# Altium integrated library 兰格封装.IntLib: 1176 symbols (part 2 of 6) (continued)
## HDR  2.54MM  1X16
designator P*
仓库名称: 五金仓; 加工方式: 插件; 助记码: *; 单位: *; 备注: *; 物料代码: *; 物料名称: *; 规格型号: *
footprint HDR-1X16 (排针，16脚)
pins: 1, 2, 3, 4, 5, 6, 7, 8, 9, 10, 11, 12, 13, 14, 15, 16

## HDR  2.54MM  1X16_M
designator P*
仓库名称: 五金仓; 加工方式: 插件; 助记码: *; 规格型号: *; 物料代码: *; 物料名称: *; 单位: *; 备注: *
footprint HDR-1X16_M (排母，16脚)
pins: 1, 2, 3, 4, 5, 6, 7, 8, 9, 10, 11, 12, 13, 14, 15, 16

## HDR  2.54MM  1X16_W
designator P*
仓库名称: 五金仓; 加工方式: 插件; 助记码: *; 单位: *; 备注: *; 物料代码: *; 物料名称: *; 规格型号: *
footprint HDR-1X16_W (弯脚排针，16脚)
pins: 1, 2, 3, 4, 5, 6, 7, 8, 9, 10, 11, 12, 13, 14, 15, 16

## HDR  2.54MM  1X16_Y
designator P*
仓库名称: 五金仓; 加工方式: 插件; 物料名称: *; 规格型号: *; 助记码: *; 单位: *; 备注: *; 物料代码: *
footprint HDR-1X16_Y (圆孔排母，16脚)
pins: 1, 2, 3, 4, 5, 6, 7, 8, 9, 10, 11, 12, 13, 14, 15, 16

## HDR  2.54MM  1X17
designator P*
仓库名称: 五金仓; 加工方式: 插件; 单位: *; 助记码: *; 备注: *; 规格型号: *; 物料名称: *; 物料代码: *
footprint HDR-1X17 (排针，17脚)
pins: 1, 2, 3, 4, 5, 6, 7, 8, 9, 10, 11, 12, 13, 14, 15, 16, 17

## HDR  2.54MM  1X17_M
designator P*
仓库名称: 五金仓; 加工方式: 插件; 助记码: *; 单位: *; 备注: *; 物料名称: *; 规格型号: *; 物料代码: *
footprint HDR-1X17_M (排母，17脚)
pins: 1, 2, 3, 4, 5, 6, 7, 8, 9, 10, 11, 12, 13, 14, 15, 16, 17

## HDR  2.54MM  1X17_W
designator P*
仓库名称: 五金仓; 加工方式: 插件; 物料名称: *; 规格型号: *; 助记码: *; 单位: *; 备注: *; 物料代码: *
footprint HDR-1X17_W (弯脚排针，17脚)
pins: 1, 2, 3, 4, 5, 6, 7, 8, 9, 10, 11, 12, 13, 14, 15, 16, 17

## HDR  2.54MM  1X17_Y
designator P*
仓库名称: 五金仓; 加工方式: 插件; 物料名称: *; 规格型号: *; 物料代码: *; 助记码: *; 单位: *; 备注: *
footprint HDR-1X17_Y (圆孔排母，17脚)
pins: 1, 2, 3, 4, 5, 6, 7, 8, 9, 10, 11, 12, 13, 14, 15, 16, 17

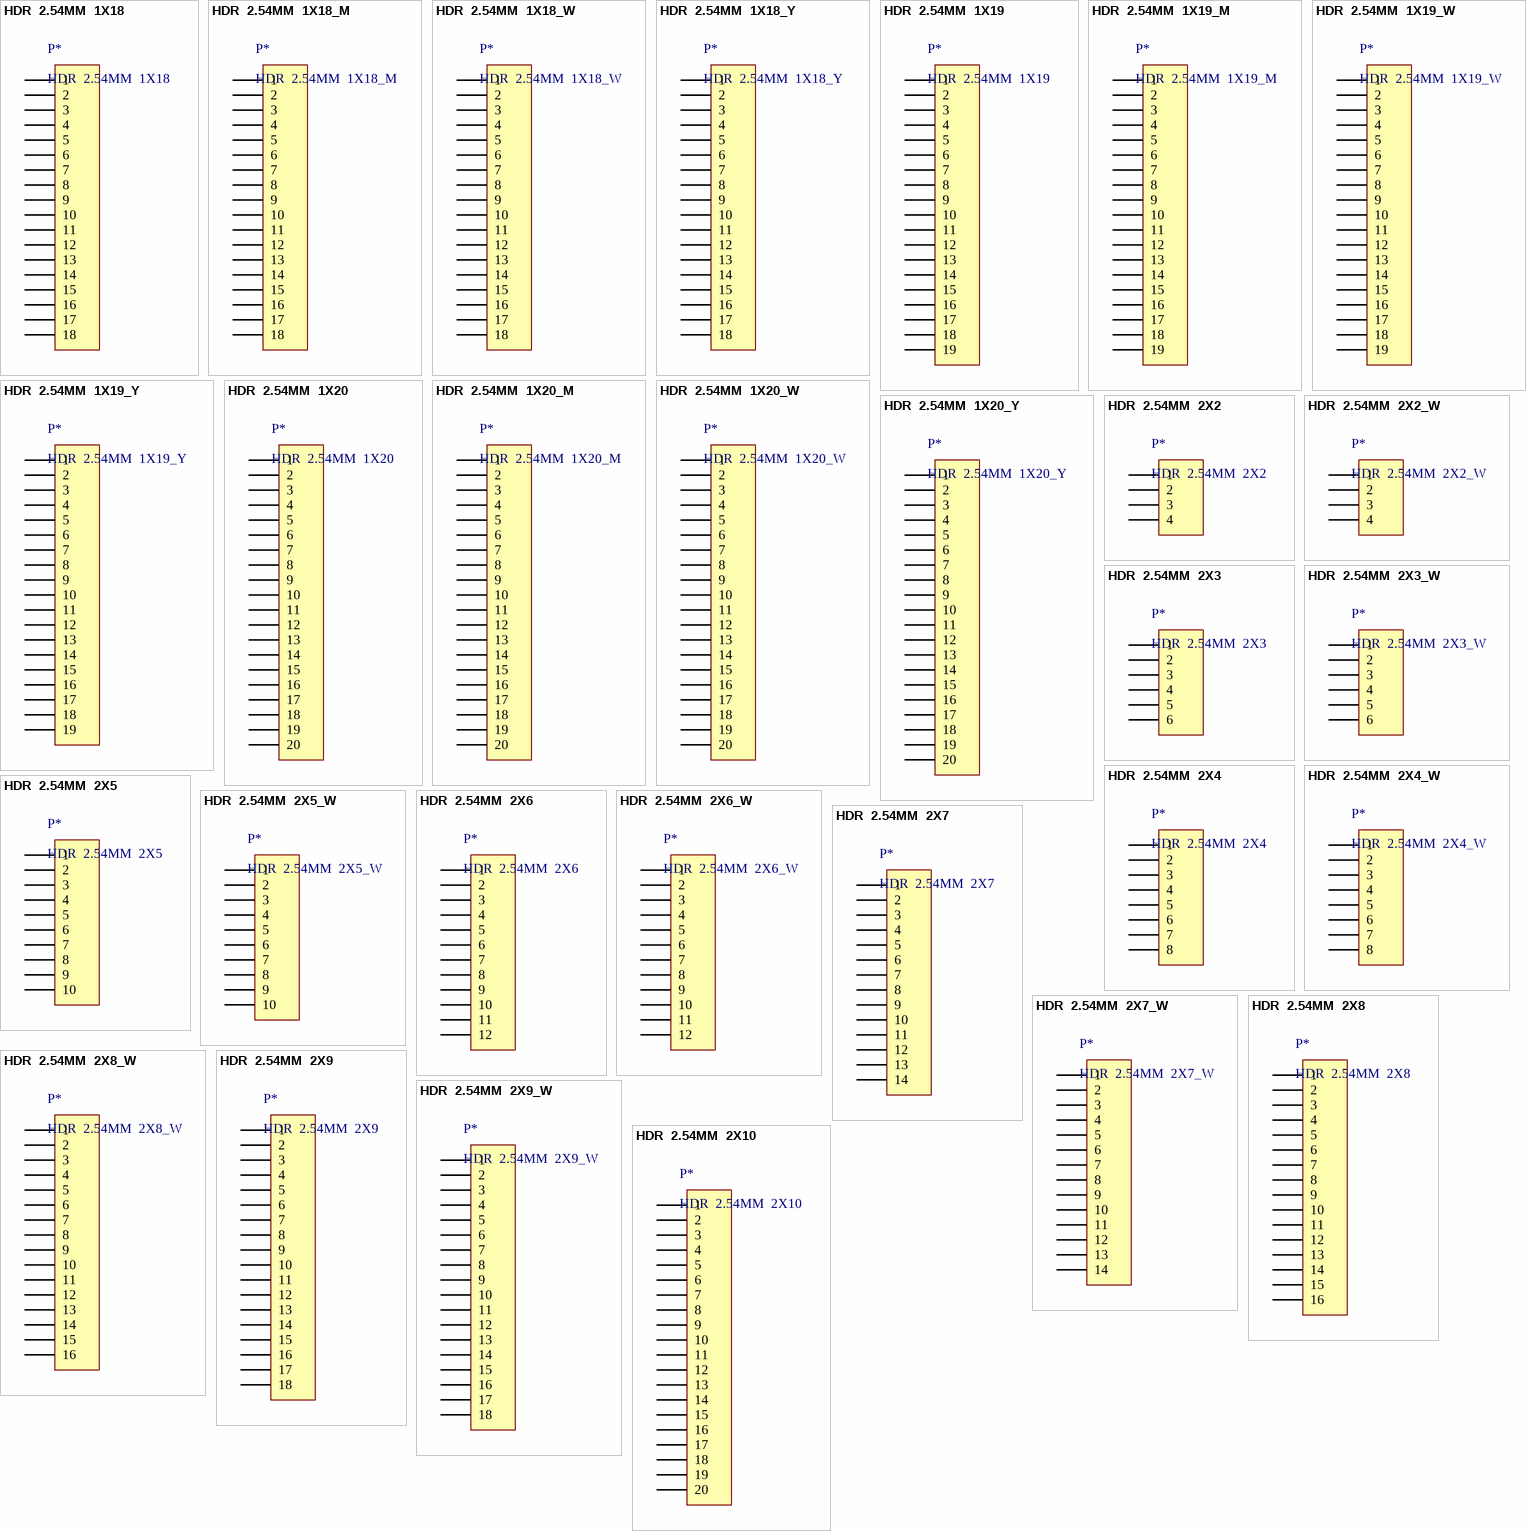
[diagram p19: symbols HDR  2.54MM  1X18 to HDR  2.54MM  2X10]

## HDR  2.54MM  1X18
designator P*
仓库名称: 五金仓; 加工方式: 插件; 助记码: *; 物料代码: *; 规格型号: *; 物料名称: *; 单位: *; 备注: *
footprint HDR-1X18 (排针，18脚)
pins: 1, 2, 3, 4, 5, 6, 7, 8, 9, 10, 11, 12, 13, 14, 15, 16, 17, 18

## HDR  2.54MM  1X18_M
designator P*
仓库名称: 五金仓; 加工方式: 插件; 助记码: *; 单位: *; 备注: *; 物料代码: *; 物料名称: *; 规格型号: *
footprint HDR-1X18_M (排母，18脚)
pins: 1, 2, 3, 4, 5, 6, 7, 8, 9, 10, 11, 12, 13, 14, 15, 16, 17, 18

## HDR  2.54MM  1X18_W
designator P*
仓库名称: 五金仓; 加工方式: 插件; 单位: *; 备注: *; 助记码: *; 物料代码: *; 物料名称: *; 规格型号: *
footprint HDR-1X18_W (弯脚排针，18脚)
pins: 1, 2, 3, 4, 5, 6, 7, 8, 9, 10, 11, 12, 13, 14, 15, 16, 17, 18

## HDR  2.54MM  1X18_Y
designator P*
仓库名称: 五金仓; 加工方式: 插件; 助记码: *; 单位: *; 备注: *; 物料代码: *; 物料名称: *; 规格型号: *
footprint HDR-1X18_Y (圆孔排母，18脚)
pins: 1, 2, 3, 4, 5, 6, 7, 8, 9, 10, 11, 12, 13, 14, 15, 16, 17, 18

## HDR  2.54MM  1X19
designator P*
仓库名称: 五金仓; 加工方式: 插件; 助记码: *; 单位: *; 物料代码: *; 物料名称: *; 备注: *; 规格型号: *
footprint HDR-1X19 (排针，19脚)
pins: 1, 2, 3, 4, 5, 6, 7, 8, 9, 10, 11, 12, 13, 14, 15, 16, 17, 18, 19

## HDR  2.54MM  1X19_M
designator P*
仓库名称: 五金仓; 加工方式: 插件; 物料名称: *; 规格型号: *; 助记码: *; 单位: *; 备注: *; 物料代码: *
footprint HDR-1X19_M (排母，19脚)
pins: 1, 2, 3, 4, 5, 6, 7, 8, 9, 10, 11, 12, 13, 14, 15, 16, 17, 18, 19

## HDR  2.54MM  1X19_W
designator P*
仓库名称: 五金仓; 加工方式: 插件; 物料代码: *; 备注: *; 规格型号: *; 物料名称: *; 助记码: *; 单位: *
footprint HDR-1X19_W (弯脚排针，19脚)
pins: 1, 2, 3, 4, 5, 6, 7, 8, 9, 10, 11, 12, 13, 14, 15, 16, 17, 18, 19

## HDR  2.54MM  1X19_Y
designator P*
仓库名称: 五金仓; 加工方式: 插件; 物料名称: *; 规格型号: *; 助记码: *; 单位: *; 备注: *; 物料代码: *
footprint HDR-1X19_Y (圆孔排母，19脚)
pins: 1, 2, 3, 4, 5, 6, 7, 8, 9, 10, 11, 12, 13, 14, 15, 16, 17, 18, 19

## HDR  2.54MM  1X20
designator P*
仓库名称: 五金仓; 加工方式: 插件; 规格型号: *; 物料名称: *; 助记码: *; 单位: *; 备注: *; 物料代码: *
footprint HDR-1X20 (排针，20脚)
pins: 1, 2, 3, 4, 5, 6, 7, 8, 9, 10, 11, 12, 13, 14, 15, 16, 17, 18, 19, 20

## HDR  2.54MM  1X20_M
designator P*
仓库名称: 五金仓; 加工方式: 插件; 助记码: *; 单位: *; 物料代码: *; 物料名称: *; 备注: *; 规格型号: *
footprint HDR-1X20_M (排母，20脚)
pins: 1, 2, 3, 4, 5, 6, 7, 8, 9, 10, 11, 12, 13, 14, 15, 16, 17, 18, 19, 20

## HDR  2.54MM  1X20_W
designator P*
仓库名称: 五金仓; 加工方式: 插件; 物料代码: *; 规格型号: *; 辛苦名称: *; 助记码: *; 单位: *; 备注: *
footprint HDR-1X20_W (弯脚排针，20脚)
pins: 1, 2, 3, 4, 5, 6, 7, 8, 9, 10, 11, 12, 13, 14, 15, 16, 17, 18, 19, 20

## HDR  2.54MM  1X20_Y
designator P*
仓库名称: 五金仓; 加工方式: 插件; 物料名称: *; 规格型号: *; 物料代码: *; 单位: *; 助记码: *; 备注: *
footprint HDR-1X20_Y (圆孔排母，20脚)
pins: 1, 2, 3, 4, 5, 6, 7, 8, 9, 10, 11, 12, 13, 14, 15, 16, 17, 18, 19, 20

## HDR  2.54MM  2X2
designator P*
仓库名称: 五金仓; 加工方式: 插件; 规格型号: *; 物料代码: *; 物料名称: *; 助记码: *; 单位: *; 备注: *
footprint HDR-2X2 (双排排针，2x2脚)
pins: 1, 2, 3, 4

## HDR  2.54MM  2X2_W
designator P*
仓库名称: 五金仓; 加工方式: 插件; 规格型号: *; 物料名称: *; 助记码: *; 单位: *; 备注: *; 物料代码: *
footprint HDR-2X2_W (双排弯脚排针，2x2脚)
pins: 1, 2, 3, 4

## HDR  2.54MM  2X3
designator P*
仓库名称: 五金仓; 加工方式: 插件; 物料名称: *; 规格型号: *; 物料代码: *; 备注: *; 助记码: *; 单位: *
footprint HDR-3X2 (双排排针，3x2脚)
pins: 1, 2, 3, 4, 5, 6

## HDR  2.54MM  2X3_W
designator P*
仓库名称: 五金仓; 加工方式: 插件; 助记码: *; 单位: *; 备注: *; 物料代码: *; 物料名称: *; 规格型号: *
footprint HDR-3X2_W (双排弯脚排针，3x2脚)
pins: 1, 2, 3, 4, 5, 6

## HDR  2.54MM  2X4
designator P*
仓库名称: 五金仓; 加工方式: 插件; 助记码: *; 备注: *; 物料代码: *; 物料名称: *; 单位: *; 规格型号: *
footprint HDR-4X2 (双排排针，4x2脚)
pins: 1, 2, 3, 4, 5, 6, 7, 8

## HDR  2.54MM  2X4_W
designator P*
仓库名称: 五金仓; 加工方式: 插件; 规格型号: *; 物料名称: *; 单位: *; 助记码: *; 备注: *; 物料代码: *
footprint HDR-4X2_W (双排弯脚排针，4x2脚)
pins: 1, 2, 3, 4, 5, 6, 7, 8

## HDR  2.54MM  2X5
designator P*
仓库名称: 五金仓; 加工方式: 插件; 规格型号: *; 助记码: *; 单位: *; 备注: *; 物料代码: *; 物料名称: *
footprint HDR-5X2 (双排排针，5x2脚)
pins: 1, 2, 3, 4, 5, 6, 7, 8, 9, 10

## HDR  2.54MM  2X5_W
designator P*
仓库名称: 五金仓; 加工方式: 插件; 规格型号: *; 助记码: *; 备注: *; 物料代码: *; 物料名称: *; 单位: *
footprint HDR-5X2_W (双排弯脚排针，5x2脚)
pins: 1, 2, 3, 4, 5, 6, 7, 8, 9, 10

## HDR  2.54MM  2X6
designator P*
仓库名称: 五金仓; 加工方式: 插件; 物料代码: *; 备注: *; 单位: *; 助记码: *; 规格型号: *
footprint HDR-6X2 (双排排针，6x2脚)
pins: 1, 2, 3, 4, 5, 6, 7, 8, 9, 10, 11, 12

## HDR  2.54MM  2X6_W
designator P*
仓库名称: 五金仓; 加工方式: 插件; 助记码: *; 单位: *; 备注: *; 物料代码: *; 物料名称: *; 规格型号: *
footprint HDR-6X2_W (双排弯脚排针，6x2脚)
pins: 1, 2, 3, 4, 5, 6, 7, 8, 9, 10, 11, 12

## HDR  2.54MM  2X7
designator P*
仓库名称: 五金仓; 加工方式: 插件; 备注: *; 助记码: *; 单位: *; 物料代码: *; 物料名称: *; 规格型号: *
footprint HDR-7X2 (双排排针，7x2脚)
pins: 1, 2, 3, 4, 5, 6, 7, 8, 9, 10, 11, 12, 13, 14

## HDR  2.54MM  2X7_W
designator P*
仓库名称: 五金仓; 加工方式: 插件; 助记码: *; 单位: *; 备注: *; 物料代码: *; 物料名称: *; 规格型号: *
footprint HDR-7X2_W (双排弯脚排针，7x2脚)
pins: 1, 2, 3, 4, 5, 6, 7, 8, 9, 10, 11, 12, 13, 14

## HDR  2.54MM  2X8
designator P*
仓库名称: 五金仓; 加工方式: 插件; 助记码: *; 单位: *; 备注: *; 物料代码: *; 物料名称: *; 规格型号: *
footprint HDR-8X2 (双排排针，8x2脚)
pins: 1, 2, 3, 4, 5, 6, 7, 8, 9, 10, 11, 12, 13, 14, 15, 16

## HDR  2.54MM  2X8_W
designator P*
仓库名称: 五金仓; 加工方式: 插件; 物料代码: *; 单位: *; 备注: *; 助记码: *; 规格型号: *; 物料名称: *
footprint HDR-8X2_W (双排弯脚排针，8x2脚)
pins: 1, 2, 3, 4, 5, 6, 7, 8, 9, 10, 11, 12, 13, 14, 15, 16

## HDR  2.54MM  2X9
designator P*
仓库名称: 五金仓; 加工方式: 插件; 单位: *; 助记码: *; 备注: *; 我看的吗: *; 物料名称: *; 规格型号: *
footprint HDR-9X2 (双排排针，9x2脚)
pins: 1, 2, 3, 4, 5, 6, 7, 8, 9, 10, 11, 12, 13, 14, 15, 16, 17, 18

## HDR  2.54MM  2X9_W
designator P*
仓库名称: 五金仓; 加工方式: 插件; 助记码: *; 单位: *; 备注: *; 物料代码: *; 物料名称: *; 规格型号: *
footprint HDR-9X2_W (双排弯脚排针，9x2脚)
pins: 1, 2, 3, 4, 5, 6, 7, 8, 9, 10, 11, 12, 13, 14, 15, 16, 17, 18

## HDR  2.54MM  2X10
designator P*
仓库名称: 五金仓; 加工方式: 插件; 助记码: *; 单位: *; 物料代码: *; 物料名称: *; 规格型号: *; 备注: *
footprint HDR-10X2 (双排排针，10x2脚)
pins: 1, 2, 3, 4, 5, 6, 7, 8, 9, 10, 11, 12, 13, 14, 15, 16, 17, 18, 19, 20

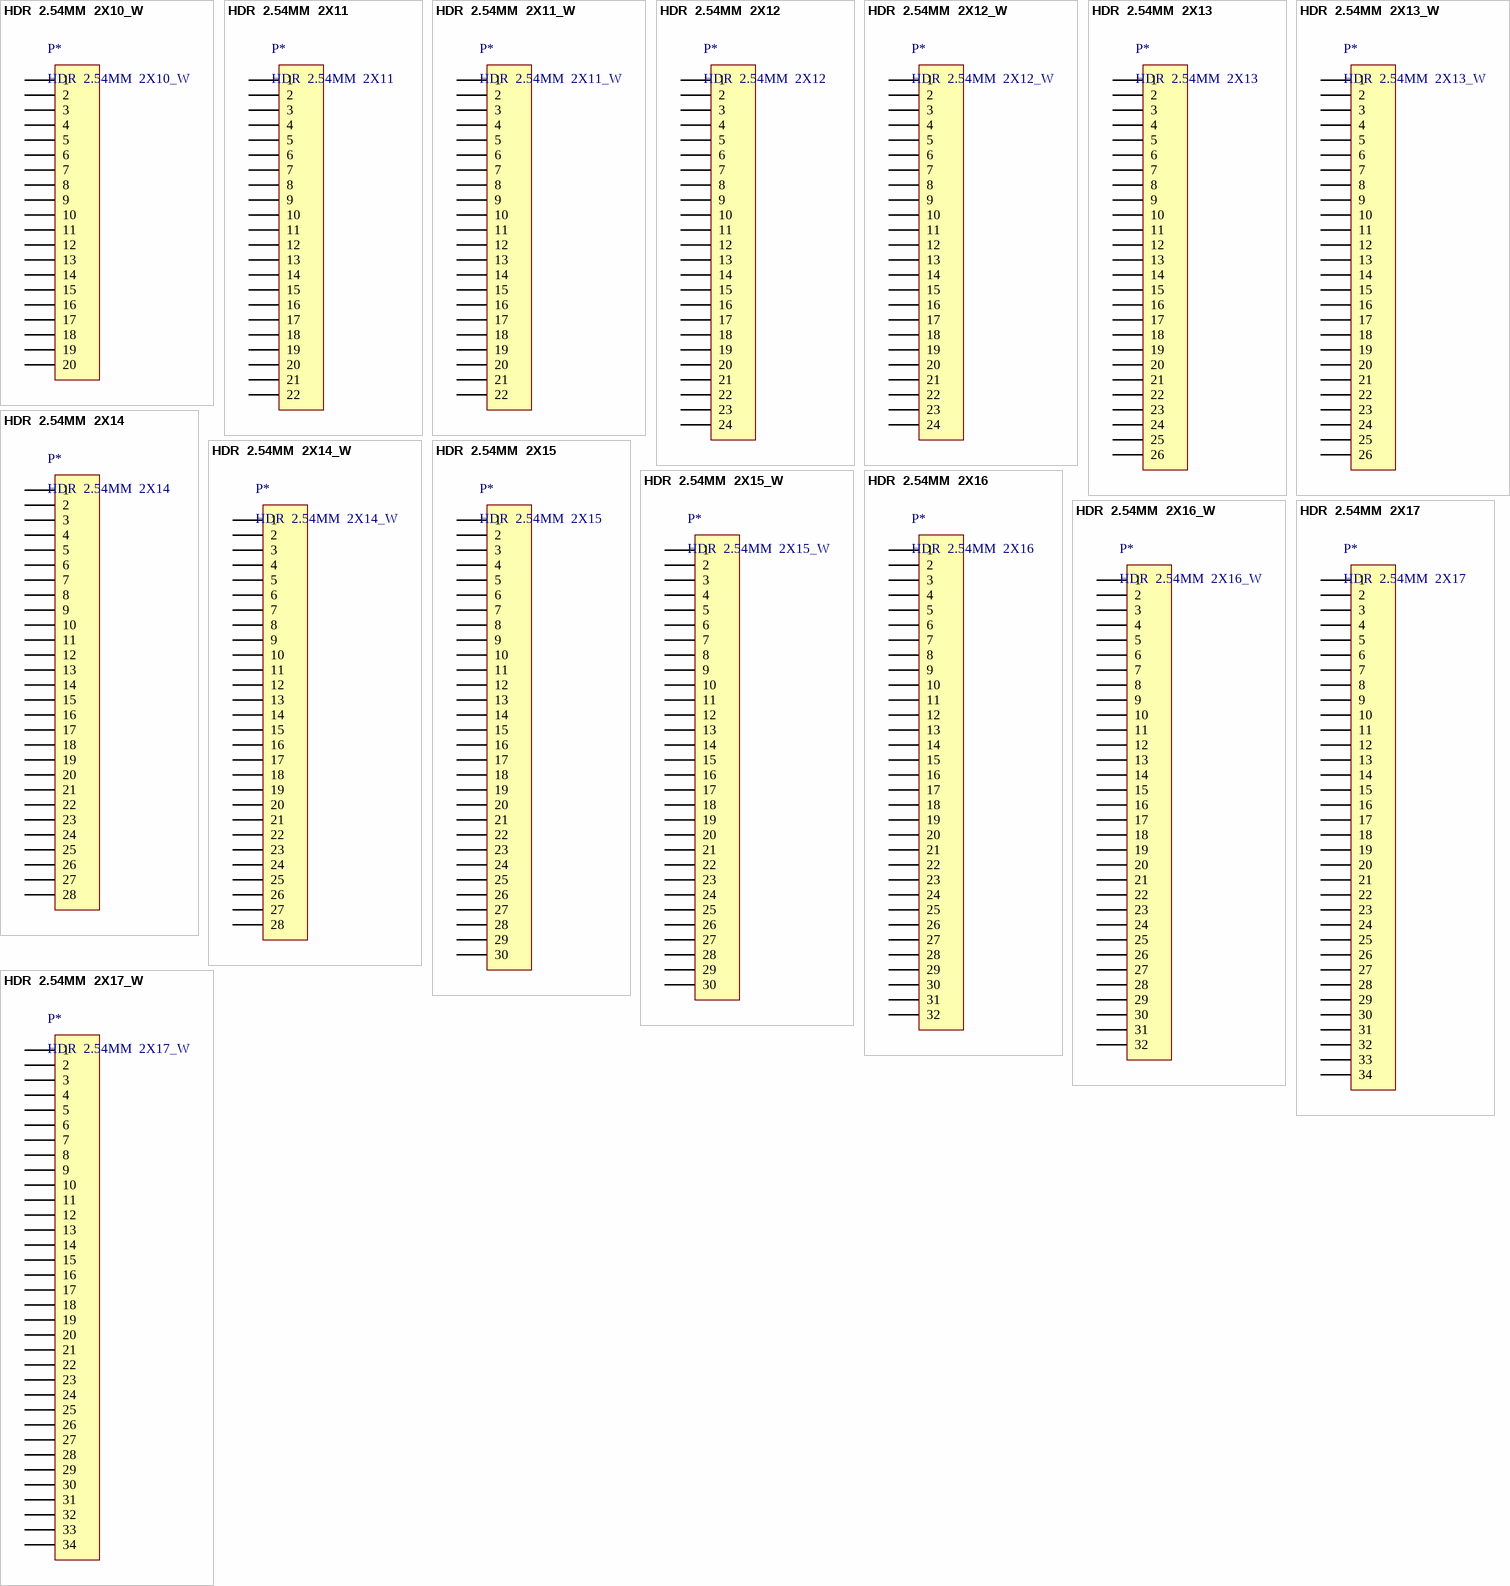
[diagram p20: symbols HDR  2.54MM  2X10_W to HDR  2.54MM  2X17_W]

## HDR  2.54MM  2X10_W
designator P*
仓库名称: 五金仓; 加工方式: 插件; 物料名称: *; 规格型号: *; 单位: *; 助记码: *; 备注: *; 物料代码: *
footprint HDR-10X2_W
pins: 1, 2, 3, 4, 5, 6, 7, 8, 9, 10, 11, 12, 13, 14, 15, 16, 17, 18, 19, 20

## HDR  2.54MM  2X11
designator P*
仓库名称: 五金仓; 加工方式: 插件; 助记码: *; 单位: *; 规格型号: *; 物料名称: *; 物料代码: *
footprint HDR-11X2 (双排排针，11x2脚)
pins: 1, 2, 3, 4, 5, 6, 7, 8, 9, 10, 11, 12, 13, 14, 15, 16, 17, 18, 19, 20, 21, 22

## HDR  2.54MM  2X11_W
designator P*
仓库名称: 五金仓; 加工方式: 插件; 助记码: *; 单位: *; 备注: *; 物料代码: *; 物料名称: *; 规格型号: *
footprint HDR-11X2_W (双排弯脚排针，11x2脚)
pins: 1, 2, 3, 4, 5, 6, 7, 8, 9, 10, 11, 12, 13, 14, 15, 16, 17, 18, 19, 20, 21, 22

## HDR  2.54MM  2X12
designator P*
仓库名称: 五金仓; 加工方式: 插件; 助记码: *; 单位: *; 物料代码: *; 物料名称: *; 备注: *; 规格型号: *
footprint HDR-12X2 (双排排针，12x2脚)
pins: 1, 2, 3, 4, 5, 6, 7, 8, 9, 10, 11, 12, 13, 14, 15, 16, 17, 18, 19, 20, 21, 22, 23, 24

## HDR  2.54MM  2X12_W
designator P*
仓库名称: 五金仓; 加工方式: 插件; 助记码: *; 单位: *; 备注: *; 物料代码: *; 规格型号: *
footprint HDR-12X2_W (双排弯脚排针，12x2脚)
pins: 1, 2, 3, 4, 5, 6, 7, 8, 9, 10, 11, 12, 13, 14, 15, 16, 17, 18, 19, 20, 21, 22, 23, 24

## HDR  2.54MM  2X13
designator P*
仓库名称: 五金仓; 加工方式: 插件; 助记码: *; 单位: *; 备注: *; 物料代码: *; 物料名称: *; 规格型号: *
footprint HDR-13X2 (双排排针，13x2脚)
pins: 1, 2, 3, 4, 5, 6, 7, 8, 9, 10, 11, 12, 13, 14, 15, 16, 17, 18, 19, 20, 21, 22, 23, 24, 25, 26

## HDR  2.54MM  2X13_W
designator P*
仓库名称: 五金仓; 加工方式: 插件; 备注: *; 物料代码: *; 单位: *; 助记码: *; 物料名称: *; 规格型号: *
footprint HDR-13X2_W (双排弯脚排针，13x2脚)
pins: 1, 2, 3, 4, 5, 6, 7, 8, 9, 10, 11, 12, 13, 14, 15, 16, 17, 18, 19, 20, 21, 22, 23, 24, 25, 26

## HDR  2.54MM  2X14
designator P*
仓库名称: 五金仓; 加工方式: 插件; 助记码: *; 单位: *; 备注: *; 物料代码: *; 物料名称: *; 规格型号: *
footprint HDR-14X2 (双排排针，14x2脚)
pins: 1, 2, 3, 4, 5, 6, 7, 8, 9, 10, 11, 12, 13, 14, 15, 16, 17, 18, 19, 20, 21, 22, 23, 24, 25, 26, 27, 28

## HDR  2.54MM  2X14_W
designator P*
加工方式: 插件; 仓库名称: 五金仓; 物料代码: *; 物料名称: *; 助记码: *; 规格型号: *; 单位: *
footprint HDR-14X2_W (双排弯脚排针，14x2脚)
pins: 1, 2, 3, 4, 5, 6, 7, 8, 9, 10, 11, 12, 13, 14, 15, 16, 17, 18, 19, 20, 21, 22, 23, 24, 25, 26, 27, 28

## HDR  2.54MM  2X15
designator P*
仓库名称: 五金仓; 加工方式: 插件; 单位: *; 助记码: *; 备注: *; 物料代码: *; 物料名称: *; 规格型号: *
footprint HDR-15X2 (双排排针，15x2脚)
pins: 1, 2, 3, 4, 5, 6, 7, 8, 9, 10, 11, 12, 13, 14, 15, 16, 17, 18, 19, 20, 21, 22, 23, 24, 25, 26, 27, 28, 29, 30

## HDR  2.54MM  2X15_W
designator P*
仓库名称: 五金仓; 加工方式: 插件; 物料名称: *; 规格型号: *; 单位: *; 助记码: *; 备注: *; 物料代码: *
footprint HDR-15X2_W (双排弯脚排针，15x2脚)
pins: 1, 2, 3, 4, 5, 6, 7, 8, 9, 10, 11, 12, 13, 14, 15, 16, 17, 18, 19, 20, 21, 22, 23, 24, 25, 26, 27, 28, 29, 30

## HDR  2.54MM  2X16
designator P*
仓库名称: 五金仓; 加工方式: 插件; 物料名称: *; 规格型号: *; 助记码: *; 单位: *; 备注: *; 物料代码: *
footprint HDR-16X2 (双排排针，16x2脚)
pins: 1, 2, 3, 4, 5, 6, 7, 8, 9, 10, 11, 12, 13, 14, 15, 16, 17, 18, 19, 20, 21, 22, 23, 24, 25, 26, 27, 28, 29, 30, 31, 32

## HDR  2.54MM  2X16_W
designator P*
仓库名称: 五金仓; 加工方式: 插件; 物料名称: *; 规格型号: *; 单位: *; 助记码: *; 物料代码: *; 备注: *
footprint HDR-16X2_W (双排弯脚排针，16x2脚)
pins: 1, 2, 3, 4, 5, 6, 7, 8, 9, 10, 11, 12, 13, 14, 15, 16, 17, 18, 19, 20, 21, 22, 23, 24, 25, 26, 27, 28, 29, 30, 31, 32

## HDR  2.54MM  2X17
designator P*
仓库名称: 五金仓; 加工方式: 插件; 物料名称: *; 规格型号: *; 物料代码: *; 助记码: *; 单位: *; 备注: *
footprint HDR-17X2 (双排排针，17x2脚)
pins: 1, 2, 3, 4, 5, 6, 7, 8, 9, 10, 11, 12, 13, 14, 15, 16, 17, 18, 19, 20, 21, 22, 23, 24, 25, 26, 27, 28, 29, 30, 31, 32, 33, 34

## HDR  2.54MM  2X17_W
designator P*
仓库名称: 五金仓; 加工方式: 插件; 单位: *; 助记码: *; 规格型号: *; 备注: *; 物料代码: *; 物料名称: *
footprint HDR-17X2_W (双排弯脚排针，17x2脚)
pins: 1, 2, 3, 4, 5, 6, 7, 8, 9, 10, 11, 12, 13, 14, 15, 16, 17, 18, 19, 20, 21, 22, 23, 24, 25, 26, 27, 28, 29, 30, 31, 32, 33, 34

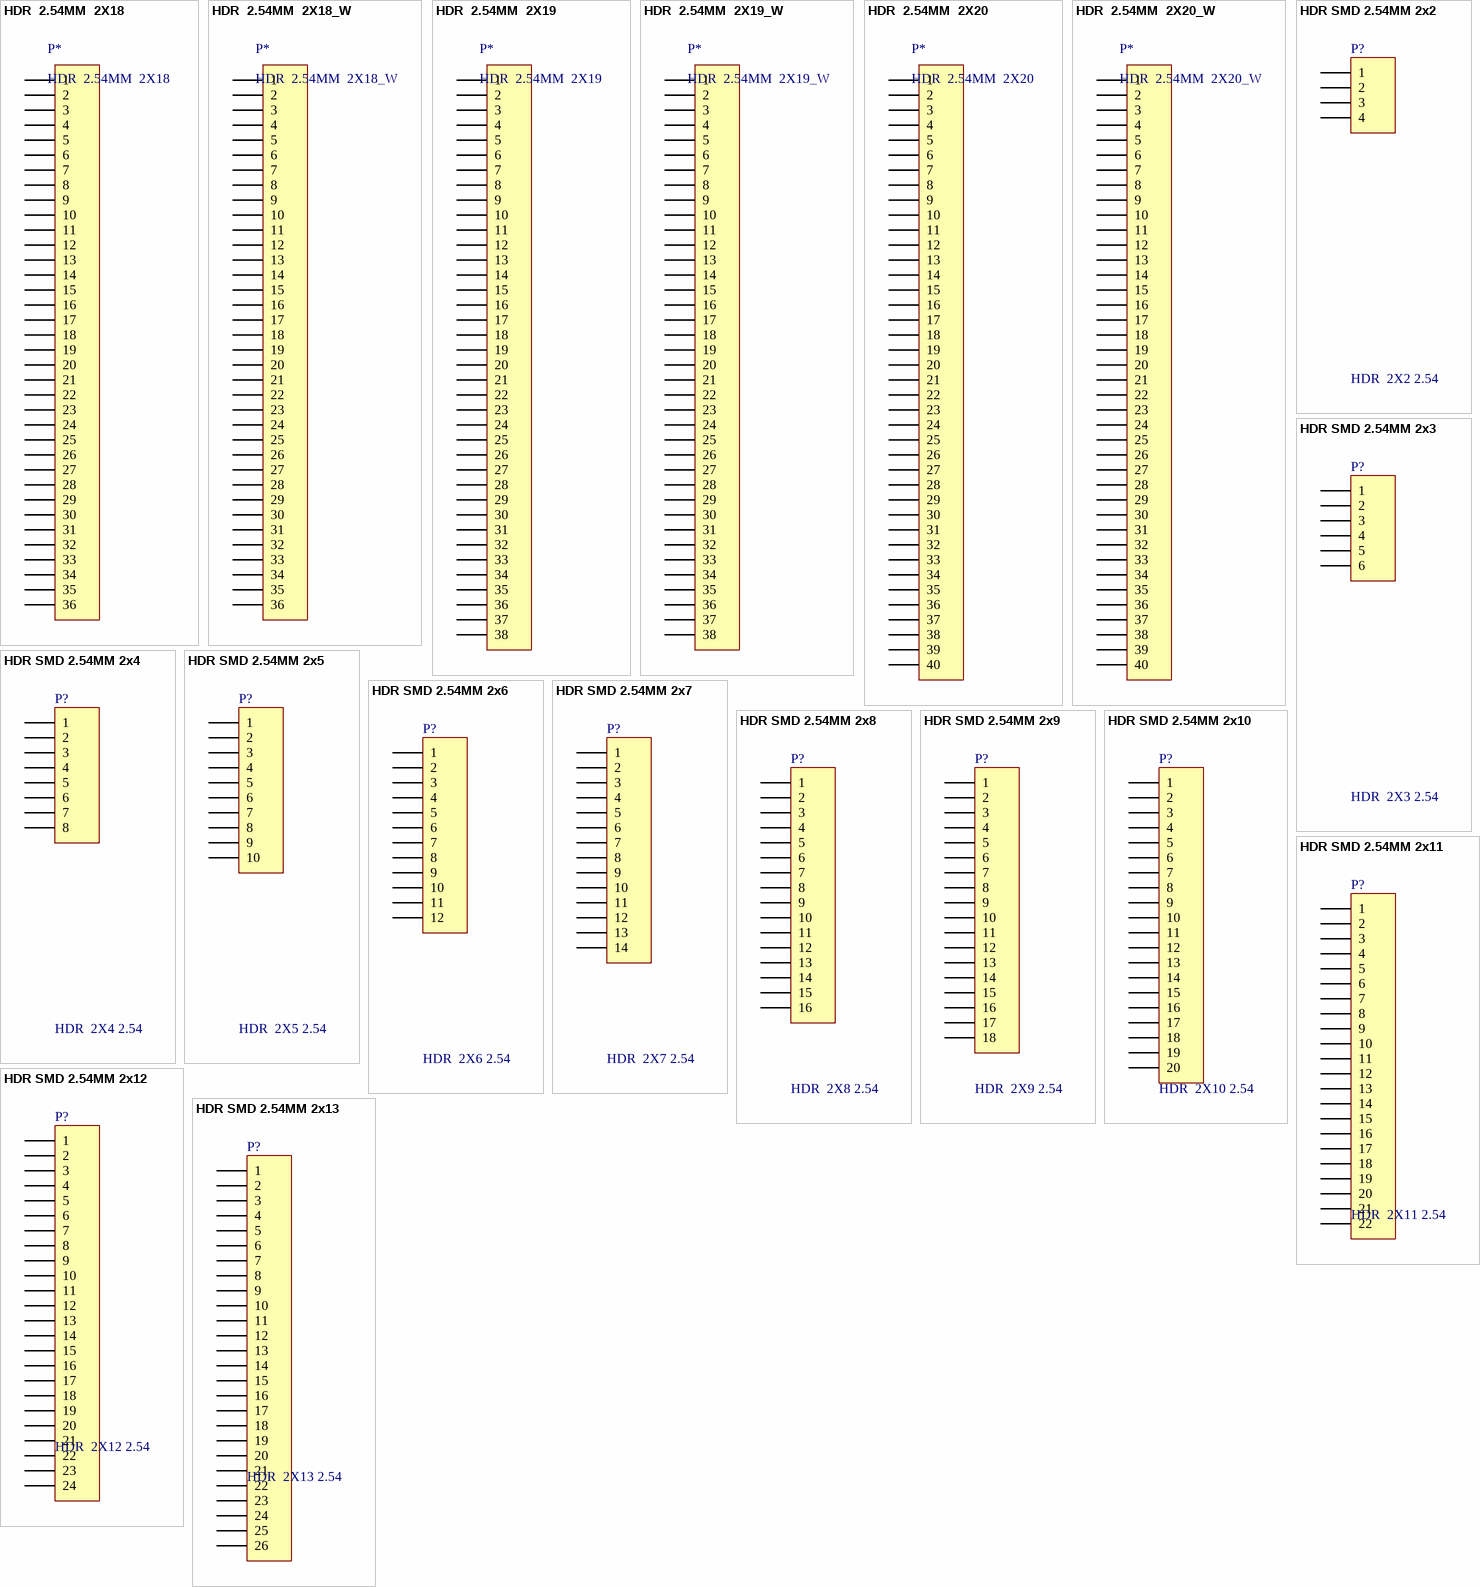
[diagram p21: symbols HDR  2.54MM  2X18 to HDR SMD 2.54MM 2x13]

## HDR  2.54MM  2X18
designator P*
仓库名称: 五金仓; 加工方式: 插件; 助记码: *; 规格型号: *; 单位: *; 备注: *; 物料代码: *; 物料名称: *
footprint HDR-18X2 (双排排针，18x2脚)
pins: 1, 2, 3, 4, 5, 6, 7, 8, 9, 10, 11, 12, 13, 14, 15, 16, 17, 18, 19, 20, 21, 22, 23, 24, 25, 26, 27, 28, 29, 30, 31, 32, 33, 34, 35, 36

## HDR  2.54MM  2X18_W
designator P*
仓库名称: 五金仓; 加工方式: 插件; 物料名称: *; 规格型号: *; 单位: *; 物料代码: *; 助记码: *; 备注: *
footprint HDR-18X2_W (双排弯脚排针，18x2脚)
pins: 1, 2, 3, 4, 5, 6, 7, 8, 9, 10, 11, 12, 13, 14, 15, 16, 17, 18, 19, 20, 21, 22, 23, 24, 25, 26, 27, 28, 29, 30, 31, 32, 33, 34, 35, 36

## HDR  2.54MM  2X19
designator P*
仓库名称: 五金仓; 加工方式: 插件; 物料名称: *; 规格型号: *; 助记码: *; 物料代码: *; 单位: *; 备注: *
footprint HDR-19X2 (双排排针，19x2脚)
pins: 1, 2, 3, 4, 5, 6, 7, 8, 9, 10, 11, 12, 13, 14, 15, 16, 17, 18, 19, 20, 21, 22, 23, 24, 25, 26, 27, 28, 29, 30, 31, 32, 33, 34, 35, 36, 37, 38

## HDR  2.54MM  2X19_W
designator P*
仓库名称: 五金仓; 加工方式: 插件; 助记码: *; 单位: *; 备注: *; 物料代码: *; 物料名称: *; 规格型号: *
footprint HDR-19X2_W (双排弯脚排针，19x2脚)
pins: 1, 2, 3, 4, 5, 6, 7, 8, 9, 10, 11, 12, 13, 14, 15, 16, 17, 18, 19, 20, 21, 22, 23, 24, 25, 26, 27, 28, 29, 30, 31, 32, 33, 34, 35, 36, 37, 38

## HDR  2.54MM  2X20
designator P*
仓库名称: 五金仓; 加工方式: 插件; 物料名称: *; 规格型号: *; 助记码: *; 单位: *; 备注: *; 物料代码: *
footprint HDR-20X2 (双排排针，20x2脚)
pins: 1, 2, 3, 4, 5, 6, 7, 8, 9, 10, 11, 12, 13, 14, 15, 16, 17, 18, 19, 20, 21, 22, 23, 24, 25, 26, 27, 28, 29, 30, 31, 32, 33, 34, 35, 36, 37, 38, 39, 40

## HDR  2.54MM  2X20_W
designator P*
仓库名称: 五金仓; 加工方式: 插件; 助记码: *; 单位: *; 备注: *; 物料代码: *; 物料名称: *; 规格型号: *
footprint HDR-20X2_W (双排弯脚排针，20x2脚)
pins: 1, 2, 3, 4, 5, 6, 7, 8, 9, 10, 11, 12, 13, 14, 15, 16, 17, 18, 19, 20, 21, 22, 23, 24, 25, 26, 27, 28, 29, 30, 31, 32, 33, 34, 35, 36, 37, 38, 39, 40

## HDR SMD 2.54MM 2x2
designator P?, comment HDR  2X2 2.54
HDR SMD 2.54MM 2x2; 仓库名称: 五金仓; 单位: ֻ; 加工方式: 贴片; 助记码: *; 备注: *; 物料代码: *; 物料名称: *; 规格型号: *
footprint HDR2.54 2x2-M-SMD (脚距：2.54mm，贴片双排母)
pins: 1, 2, 3, 4

## HDR SMD 2.54MM 2x3
designator P?, comment HDR  2X3 2.54
HDR SMD 2.54MM 2x3; 仓库名称: 五金仓; 单位: ֻ; 加工方式: 贴片; 助记码: *; 备注: *; 物料代码: *; 物料名称: *; 规格型号: *
footprint HDR2.54 2x3-M-SMD (脚距：2.54mm，贴片双排母)
pins: 1, 2, 3, 4, 5, 6

## HDR SMD 2.54MM 2x4
designator P?, comment HDR  2X4 2.54
HDR SMD 2.54MM 2x4; 仓库名称: 五金仓; 单位: ֻ; 加工方式: 贴片; 助记码: *; 备注: *; 物料代码: *; 物料名称: *; 规格型号: *
footprint HDR2.54 2x4-M-SMD (脚距：2.54mm，贴片双排母)
pins: 1, 2, 3, 4, 5, 6, 7, 8

## HDR SMD 2.54MM 2x5
designator P?, comment HDR  2X5 2.54
HDR SMD 2.54MM 2x5; 仓库名称: 五金仓; 单位: ֻ; 加工方式: 贴片; 助记码: *; 备注: *; 物料代码: *; 物料名称: *; 规格型号: *
footprint HDR2.54 2x5-M-SMD (脚距：2.54mm，贴片双排母)
pins: 1, 2, 3, 4, 5, 6, 7, 8, 9, 10

## HDR SMD 2.54MM 2x6
designator P?, comment HDR  2X6 2.54
HDR SMD 2.54MM 2x6; 仓库名称: 五金仓; 单位: ֻ; 加工方式: 贴片; 助记码: *; 备注: *; 物料代码: *; 物料名称: *; 规格型号: *
footprint HDR2.54 2x6-M-SMD (脚距：2.54mm，贴片双排母)
pins: 1, 2, 3, 4, 5, 6, 7, 8, 9, 10, 11, 12

## HDR SMD 2.54MM 2x7
designator P?, comment HDR  2X7 2.54
HDR SMD 2.54MM 2x7; 仓库名称: 五金仓; 单位: ֻ; 加工方式: 贴片; 助记码: *; 备注: *; 物料代码: *; 物料名称: *; 规格型号: *
footprint HDR2.54 2x7-M-SMD (脚距：2.54mm，贴片双排母)
pins: 1, 2, 3, 4, 5, 6, 7, 8, 9, 10, 11, 12, 13, 14

## HDR SMD 2.54MM 2x8
designator P?, comment HDR  2X8 2.54
HDR SMD 2.54MM 2x8; 仓库名称: 五金仓; 单位: ֻ; 加工方式: 贴片; 助记码: *; 备注: *; 物料代码: *; 物料名称: *; 规格型号: *
footprint HDR2.54 2x8-M-SMD (脚距：2.54mm，贴片双排母)
pins: 1, 2, 3, 4, 5, 6, 7, 8, 9, 10, 11, 12, 13, 14, 15, 16

## HDR SMD 2.54MM 2x9
designator P?, comment HDR  2X9 2.54
HDR SMD 2.54MM 2x9; 仓库名称: 五金仓; 单位: ֻ; 加工方式: 贴片; 助记码: *; 备注: *; 物料代码: *; 物料名称: *; 规格型号: *
footprint HDR2.54 2x9-M-SMD (脚距：2.54mm，贴片双排母)
pins: 1, 2, 3, 4, 5, 6, 7, 8, 9, 10, 11, 12, 13, 14, 15, 16, 17, 18

## HDR SMD 2.54MM 2x10
designator P?, comment HDR  2X10 2.54
HDR SMD 2.54MM 2x10; 仓库名称: 五金仓; 单位: ֻ; 加工方式: 贴片; 助记码: *; 备注: *; 物料代码: *; 物料名称: *; 规格型号: *
footprint HDR2.54 2x10-M-SMD (脚距：2.54mm，贴片双排母)
pins: 1, 2, 3, 4, 5, 6, 7, 8, 9, 10, 11, 12, 13, 14, 15, 16, 17, 18, 19, 20

## HDR SMD 2.54MM 2x11
designator P?, comment HDR  2X11 2.54
HDR SMD 2.54MM 2x11; 仓库名称: 五金仓; 单位: ֻ; 加工方式: 贴片; 助记码: *; 备注: *; 物料代码: *; 物料名称: *; 规格型号: *
footprint HDR2.54 2x11-M-SMD (脚距：2.54mm，贴片双排母)
pins: 1, 2, 3, 4, 5, 6, 7, 8, 9, 10, 11, 12, 13, 14, 15, 16, 17, 18, 19, 20, 21, 22

## HDR SMD 2.54MM 2x12
designator P?, comment HDR  2X12 2.54
HDR SMD 2.54MM 2x12; 仓库名称: 五金仓; 单位: ֻ; 加工方式: 贴片; 助记码: *; 备注: *; 物料代码: *; 物料名称: *; 规格型号: *
footprint HDR2.54 2x12-M-SMD (脚距：2.54mm，贴片双排母)
pins: 1, 2, 3, 4, 5, 6, 7, 8, 9, 10, 11, 12, 13, 14, 15, 16, 17, 18, 19, 20, 21, 22, 23, 24

## HDR SMD 2.54MM 2x13
designator P?, comment HDR  2X13 2.54
HDR SMD 2.54MM 2x13; 仓库名称: 五金仓; 单位: ֻ; 加工方式: 贴片; 助记码: *; 备注: *; 物料代码: *; 物料名称: *; 规格型号: *
footprint HDR2.54 2x13-M-SMD (脚距：2.54mm，贴片双排母)
pins: 1, 2, 3, 4, 5, 6, 7, 8, 9, 10, 11, 12, 13, 14, 15, 16, 17, 18, 19, 20, 21, 22, 23, 24, 25, 26

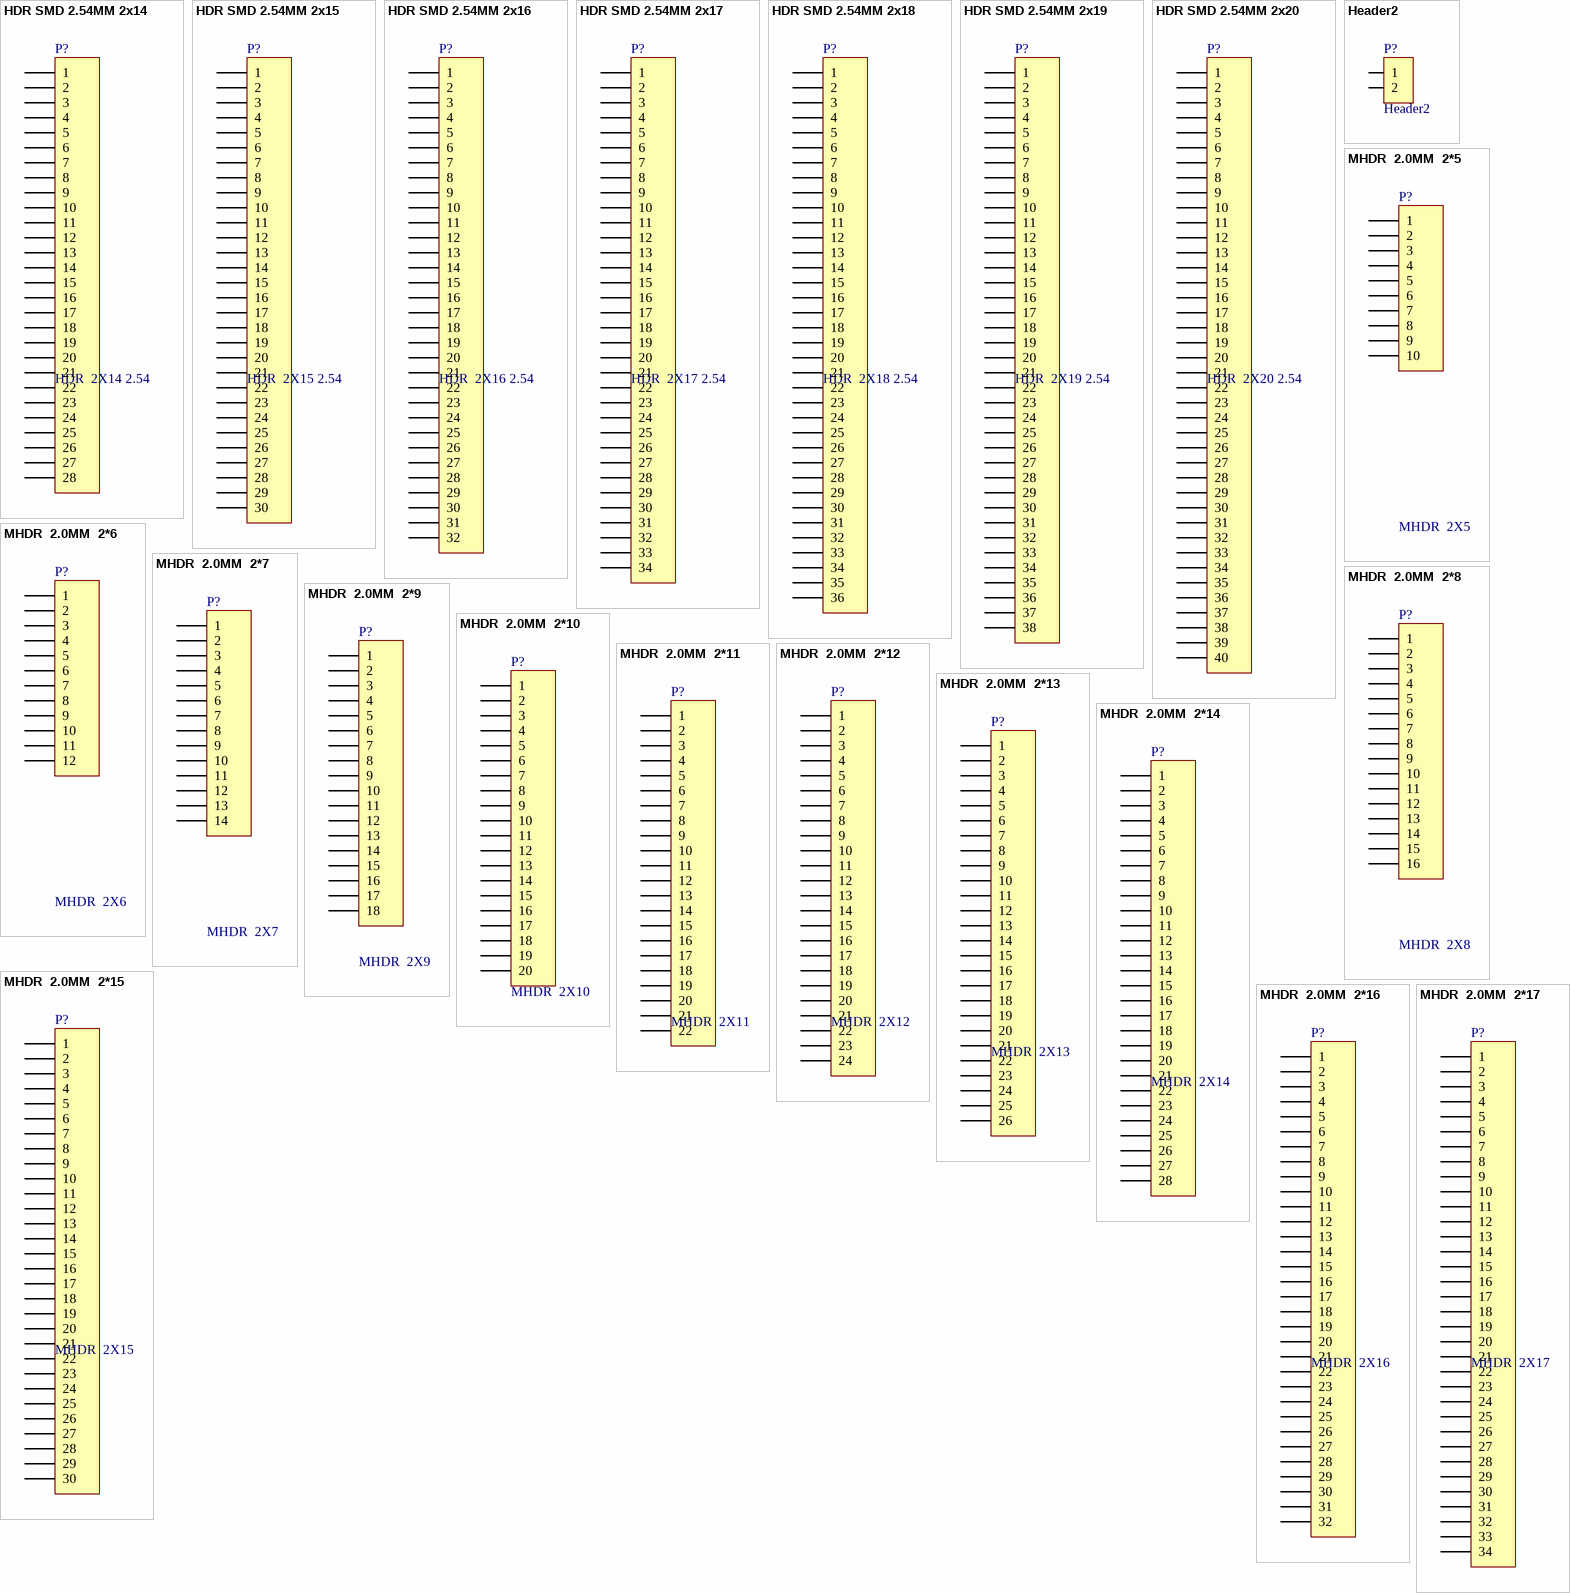
[diagram p22: symbols HDR SMD 2.54MM 2x14 to MHDR  2.0MM  2*17]

## HDR SMD 2.54MM 2x14
designator P?, comment HDR  2X14 2.54
HDR SMD 2.54MM 2x14; 仓库名称: 五金仓; 单位: ֻ; 加工方式: 贴片; 助记码: *; 备注: *; 物料代码: *; 物料名称: *; 规格型号: *
footprint HDR2.54 2x14-M-SMD (脚距：2.54mm，贴片双排母)
pins: 1, 2, 3, 4, 5, 6, 7, 8, 9, 10, 11, 12, 13, 14, 15, 16, 17, 18, 19, 20, 21, 22, 23, 24, 25, 26, 27, 28

## HDR SMD 2.54MM 2x15
designator P?, comment HDR  2X15 2.54
HDR SMD 2.54MM 2x15; 仓库名称: 五金仓; 单位: ֻ; 加工方式: 贴片; 助记码: *; 备注: *; 物料代码: *; 物料名称: *; 规格型号: *
footprint HDR2.54 2x15-M-SMD (脚距：2.54mm，贴片双排母)
pins: 1, 2, 3, 4, 5, 6, 7, 8, 9, 10, 11, 12, 13, 14, 15, 16, 17, 18, 19, 20, 21, 22, 23, 24, 25, 26, 27, 28, 29, 30

## HDR SMD 2.54MM 2x16
designator P?, comment HDR  2X16 2.54
HDR SMD 2.54MM 2x16; 仓库名称: 五金仓; 单位: ֻ; 加工方式: 贴片; 助记码: *; 备注: *; 物料代码: *; 物料名称: *; 规格型号: *
footprint HDR2.54 2x16-M-SMD (脚距：2.54mm，贴片双排母)
pins: 1, 2, 3, 4, 5, 6, 7, 8, 9, 10, 11, 12, 13, 14, 15, 16, 17, 18, 19, 20, 21, 22, 23, 24, 25, 26, 27, 28, 29, 30, 31, 32

## HDR SMD 2.54MM 2x17
designator P?, comment HDR  2X17 2.54
HDR SMD 2.54MM 2x17; 仓库名称: 五金仓; 单位: ֻ; 加工方式: 贴片; 助记码: *; 备注: *; 物料代码: *; 物料名称: *; 规格型号: *
footprint HDR2.54 2x17-M-SMD (脚距：2.54mm，贴片双排母)
pins: 1, 2, 3, 4, 5, 6, 7, 8, 9, 10, 11, 12, 13, 14, 15, 16, 17, 18, 19, 20, 21, 22, 23, 24, 25, 26, 27, 28, 29, 30, 31, 32, 33, 34

## HDR SMD 2.54MM 2x18
designator P?, comment HDR  2X18 2.54
HDR SMD 2.54MM 2x18; 仓库名称: 五金仓; 单位: ֻ; 加工方式: 贴片; 助记码: *; 备注: *; 物料代码: *; 物料名称: *; 规格型号: *
footprint HDR2.54 2x18-M-SMD (脚距：2.54mm，贴片双排母)
pins: 1, 2, 3, 4, 5, 6, 7, 8, 9, 10, 11, 12, 13, 14, 15, 16, 17, 18, 19, 20, 21, 22, 23, 24, 25, 26, 27, 28, 29, 30, 31, 32, 33, 34, 35, 36

## HDR SMD 2.54MM 2x19
designator P?, comment HDR  2X19 2.54
HDR SMD 2.54MM 2x19; 仓库名称: 五金仓; 单位: ֻ; 加工方式: 贴片; 助记码: *; 备注: *; 物料代码: *; 物料名称: *; 规格型号: *
footprint HDR2.54 2x19-M-SMD (脚距：2.54mm，贴片双排母)
pins: 1, 2, 3, 4, 5, 6, 7, 8, 9, 10, 11, 12, 13, 14, 15, 16, 17, 18, 19, 20, 21, 22, 23, 24, 25, 26, 27, 28, 29, 30, 31, 32, 33, 34, 35, 36, 37, 38

## HDR SMD 2.54MM 2x20
designator P?, comment HDR  2X20 2.54
HDR SMD 2.54MM 2x20; 仓库名称: 五金仓; 单位: ֻ; 加工方式: 贴片; 助记码: *; 备注: *; 物料代码: *; 物料名称: *; 规格型号: *
footprint HDR2.54 2x20-M-SMD (脚距：2.54mm，贴片双排母)
pins: 1, 2, 3, 4, 5, 6, 7, 8, 9, 10, 11, 12, 13, 14, 15, 16, 17, 18, 19, 20, 21, 22, 23, 24, 25, 26, 27, 28, 29, 30, 31, 32, 33, 34, 35, 36, 37, 38, 39, 40

## Header2
designator P?
仓库名称: 五金仓; 助记码: *; 单位: *; 物料名称: *; 物料代码: *; 备注: *; 规格型号: *
footprint HEADER  2H (2 PIN     3.96MM)
pins: 1, 2

## MHDR  2.0MM  2*5
designator P?, comment MHDR  2X5
Header, 10-Pin  2.0MM; 仓库名称: 五金仓; 加工方式: 插件; 备注: *; 助记码: *; 单位: *; 规格型号: *; 物料代码: *; 物料名称: *
footprint MHDR  2.0MM  2*5 (10pins)
pins: 1, 2, 3, 4, 5, 6, 7, 8, 9, 10

## MHDR  2.0MM  2*6
designator P?, comment MHDR  2X6
Header, 12-Pin  2.0MM; 仓库名称: 五金仓; 加工方式: 插件; 规格型号: *; 备注: *; 单位: *; 助记码: *; 物料代码: *; 物料名称: *
footprint MHDR  2.0MM  2*6 (12pins)
pins: 1, 2, 3, 4, 5, 6, 7, 8, 9, 10, 11, 12

## MHDR  2.0MM  2*7
designator P?, comment MHDR  2X7
Header, 14-Pin  2.0MM; 仓库名称: 五金仓; 加工方式: 插件; 规格型号: *; 物料名称: *; 物料代码: *; 备注: *; 助记码: *; 单位: *
footprint MHDR  2.0MM  2*7 (14pins)
pins: 1, 2, 3, 4, 5, 6, 7, 8, 9, 10, 11, 12, 13, 14

## MHDR  2.0MM  2*8
designator P?, comment MHDR  2X8
Header, 16-Pin  2.0MM; 物料名称: w; 仓库名称: 五金仓; 加工方式: 插件; 单位: *; 助记码: *; 规格型号: *; 物料代码: *; 备注: *
footprint MHDR  2.0MM  2*8 (16pins)
pins: 1, 2, 3, 4, 5, 6, 7, 8, 9, 10, 11, 12, 13, 14, 15, 16

## MHDR  2.0MM  2*9
designator P?, comment MHDR  2X9
Header, 18-Pin  2.0MM; 仓库名称: 五金仓; 加工方式: 插件; 助记码: *; 单位: *; 备注: *; 规格型号: *; 物料代码: *; 物料名称: *
footprint MHDR  2.0MM  2*9 (18pins)
pins: 1, 2, 3, 4, 5, 6, 7, 8, 9, 10, 11, 12, 13, 14, 15, 16, 17, 18

## MHDR  2.0MM  2*10
designator P?, comment MHDR  2X10
Header, 20-Pin  2.0MM; 仓库名称: 五金仓; 加工方式: 插件; 助记码: *; 物料名称: *; 规格型号: *; 物料代码: *; 单位: *; 备注: *
footprint MHDR  2.0MM  2*10 (20pins)
pins: 1, 2, 3, 4, 5, 6, 7, 8, 9, 10, 11, 12, 13, 14, 15, 16, 17, 18, 19, 20

## MHDR  2.0MM  2*11
designator P?, comment MHDR  2X11
Header, 22-Pin  2.0MM; 仓库名称: 五金仓; 加工方式: 插件; 备注: *; 物料名称: *; 物料代码: *; 规格型号: *; 单位: *; 助记码: *
footprint MHDR  2.0MM  2*11
pins: 1, 2, 3, 4, 5, 6, 7, 8, 9, 10, 11, 12, 13, 14, 15, 16, 17, 18, 19, 20, 21, 22

## MHDR  2.0MM  2*12
designator P?, comment MHDR  2X12
Header, 24-Pin  2.0MM; 仓库名称: 五金仓; 加工方式: 插件; 物料名称: *; 助记码: *; 物料代码: *; 备注: *; 规格型号: *
footprint MHDR  2.0MM  2*12 (24pins)
pins: 1, 2, 3, 4, 5, 6, 7, 8, 9, 10, 11, 12, 13, 14, 15, 16, 17, 18, 19, 20, 21, 22, 23, 24